# Altium footprint library Mi Libreria.PcbLib: 184 footprints (part 8 of 12)
Each footprint in its own frame and in the unit in brackets; x right, y up, seen from the top. Pads: shape width x height; smd on the part's side, far side on the other; paste and mask are expansions set on the pad; w line width, h text height; cw(c..) or ccw(c..) is an arc to the next point about the centre after c.
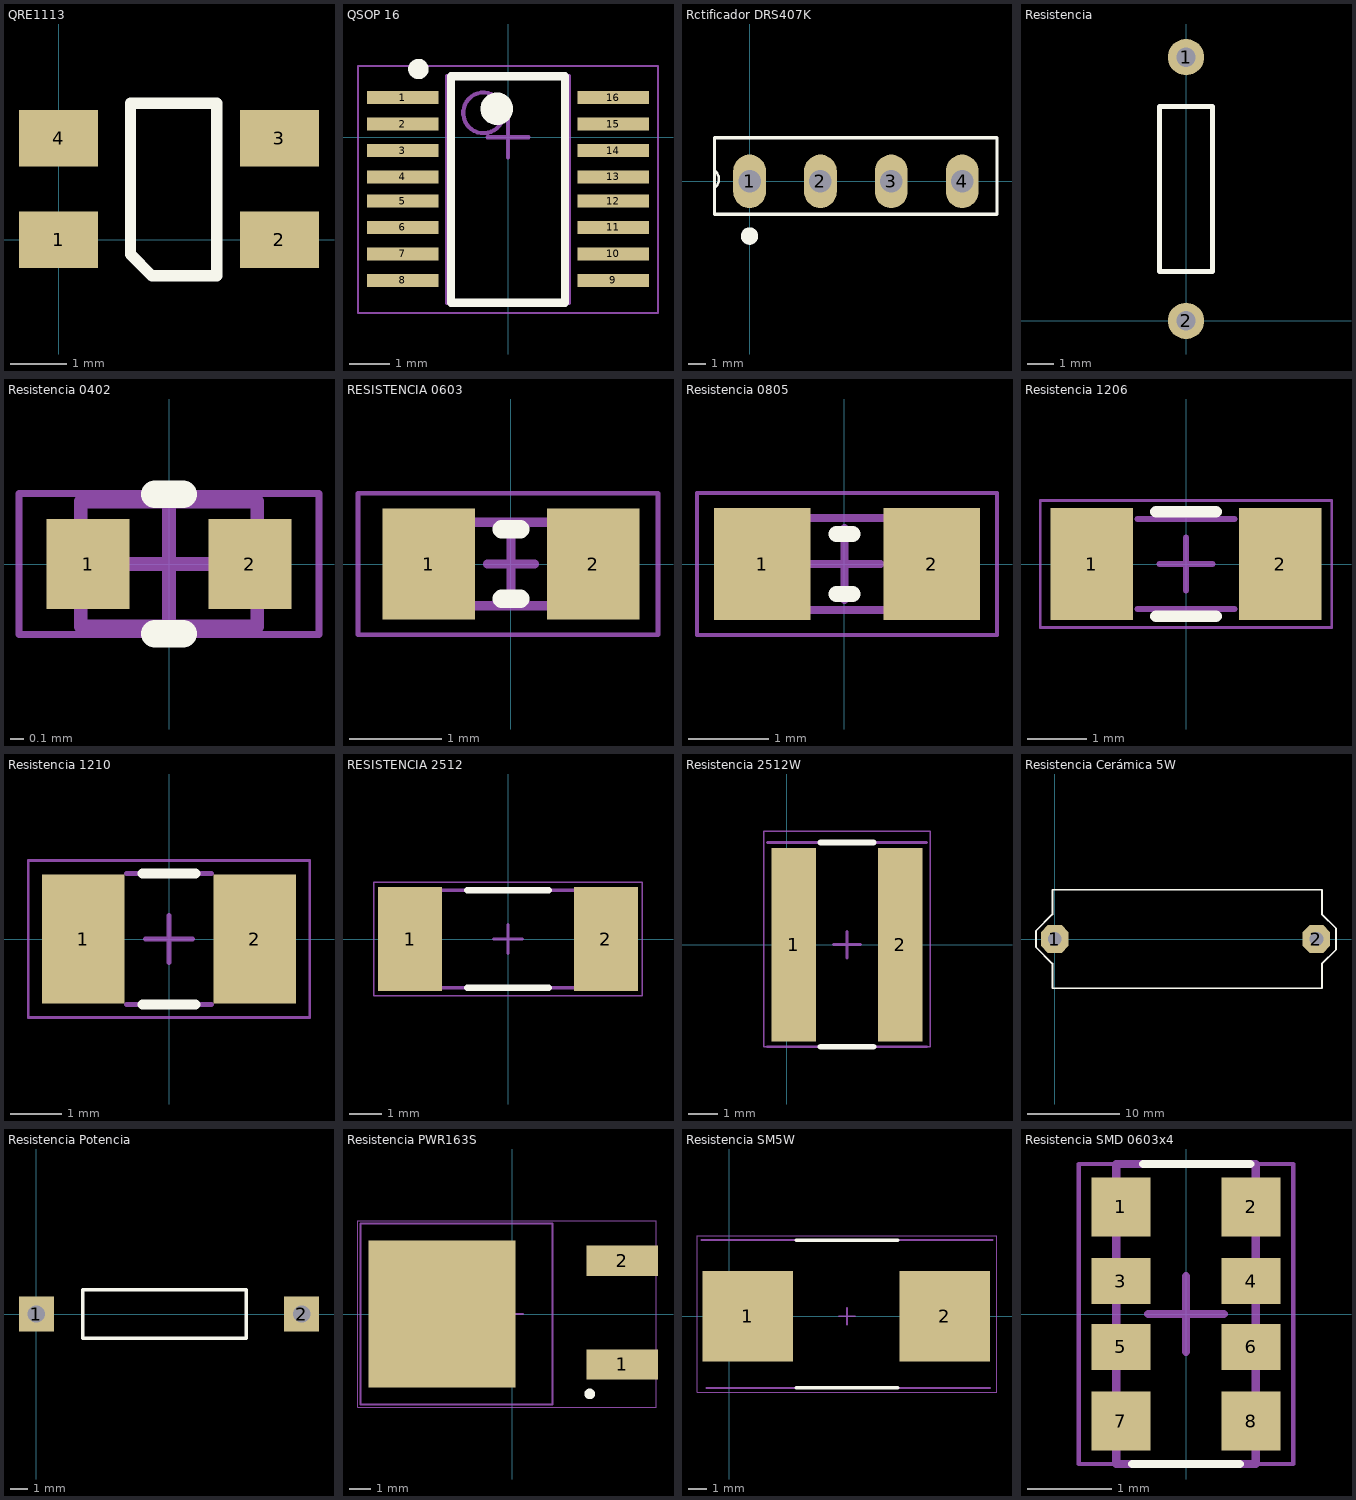
[diagram p7: the footprints below, top view; thin cyan lines are the x and y axes]

## QRE1113 [mm] "Reflective Sensor"
pads (4):
  rect 1.4x1 smd: 1(0,0) 2(3.9,0) 3(3.9,1.8) 4(0,1.8)
Top Overlay:
  lines w0.2: 1.27,-0.254 1.27,2.413 2.794,2.413 2.794,-0.635 1.651,-0.635 1.27,-0.254
3D body: height 1.6, standoff 0, extent 0.635,-0.635 3.302,2.54
3D body: height 0.35, standoff 0, extent -0.127,1.397 0.889,2.159
3D body: height 1, standoff 0, extent 0.381,1.397 0.889,2.159
3D body: height 0.35, standoff 0, extent -0.127,-0.381 0.889,0.381
3D body: height 0.35, standoff 0, extent 3.048,-0.381 4.064,0.381
3D body: height 0.35, standoff 0, extent 3.048,1.397 4.064,2.159
3D body: height 1, standoff 0, extent 0.381,-0.381 0.889,0.381
3D body: height 1, standoff 0, extent 3.048,1.397 3.556,2.159
3D body: height 1, standoff 0, extent 3.048,-0.381 3.556,0.381
3D body: height 1.8, standoff 0, extent 0.762,1.27 3.048,2.159
3D body: height 1.8, standoff 0, extent 0.762,-0.381 3.048,0.635

## QSOP 16 [mm] "QSOP 16 SMT"
pads (16):
  rect 1.75x0.325 smd: 1(-2.581,0.975) 2(-2.581,0.325) 3(-2.581,-0.325) 4(-2.581,-0.975) 5(-2.581,-1.565) 6(-2.581,-2.215) 7(-2.581,-2.865) 8(-2.581,-3.515) 9(2.581,-3.515) 10(2.581,-2.865) 11(2.581,-2.215) 12(2.581,-1.565) 13(2.581,-0.975) 14(2.581,-0.325) 15(2.581,0.325) 16(2.581,0.975)
Top Overlay:
  circle w0.25: c-2.2,1.675 r0.125
  circle w0.4: c-0.275,0.7 r0.2
  lines w0.2: -1.397,-4.064 -1.397,1.5 1.397,1.5 1.397,-4.064 -1.397,-4.064
Mechanical 13:
  circle w0.1: c-0.6,0.6 r0.5
  lines w0.1: -1.5,-4.064 -1.5,1.5 1.5,1.5 1.5,-4.064 -1.5,-4.064
Mechanical 15:
  lines w0.05: -3.683,-4.318 -3.683,1.75 3.683,1.75 3.683,-4.318 -3.683,-4.318
  lines w0.1: -0.5,0 0.5,0 ; 0,-0.5 0,0.5
3D body "QSOP16.step": height 3.12, standoff 0.03, extent -3.01,-3.715 3.01,1.175

## Rctificador DRS407K [mm] "DRS407K  Bridge Rectifier 4A"
pads (4):
  oval 1.9x3.1 hole 1.3: 1(0,0) 2(4.11,0) 3(8.22,0) 4(12.33,0)
Top Overlay:
  circle w0.5: c0,-3.175 r0.254
  lines w0.15: -2.032,-0.381 ccw(c-2.413,0.127) -2.032,0.635
  lines w0.2: 14.351,2.536 -2.032,2.54 -2.032,-1.905 14.351,-1.905 14.351,2.54
3D body: height 12, standoff 1, extent -1.524,-1.651 13.97,1.905
3D body: height 2, standoff -1, extent 11.884,-0.449 12.78,0.449
3D body: height 2, standoff -1, extent 7.774,-0.449 8.67,0.449
3D body: height 2, standoff -1, extent 3.664,-0.449 4.56,0.449
3D body: height 2, standoff -1, extent -0.446,-0.449 0.45,0.449

## Resistencia [mm] "Trough Hole 1/4W"
pads (2):
  round 1.4 hole 0.75: 1(0,10.16) 2(0,0)
Top Overlay:
  lines w0.2: -1.016,1.905 -1.016,8.255 1.016,8.255 1.016,1.905 -1.016,1.905
3D body "SW3dPS-RESISTOR, 0.25 W, 0.4 IN LEAD PITCH.STEP": height 2.93, standoff -2.54, extent -1.156,-0.305 1.156,10.465

## Resistencia 0402 [mm]
pads (2):
  rect 0.6x0.65 smd: 1(-0.583,0) 2(0.582,0)
Top Overlay:
  lines w0.2: -0.1,-0.502 0.1,-0.502 ; -0.1,0.502 0.1,0.502
Mechanical 13:
  lines w0.1: -0.635,-0.45 -0.635,0.45 0.635,0.45 0.635,-0.45 -0.635,-0.45
Mechanical 15:
  lines w0.05: -1.079,-0.508 -1.079,0.508 1.079,0.508 1.079,-0.508 -1.079,-0.508
  lines w0.1: -0.45,0 0.45,0 ; 0,-0.45 0,0.45
3D body "RESISTENCIA 0402.step": height 0.41, standoff 0, extent -0.575,-0.275 0.575,0.275

## RESISTENCIA 0603 [mm] "Chip Resistor, 2-Leads, Body 1.63x0.85mm, IPC Medium Density"
height 0.6
pads (2):
  rect 1x1.2 smd: 1(-0.889,0) 2(0.889,0)
Top Overlay:
  lines w0.2: -0.1,-0.375 0.1,-0.375 ; -0.1,0.375 0.1,0.375
Mechanical 13:
  lines w0.1: -0.825,-0.45 0.825,-0.45 0.825,0.45 -0.825,0.45 -0.825,-0.45
Mechanical 15:
  lines w0.05: -1.651,-0.762 1.587,-0.762 1.587,0.762 -1.651,0.762 -1.651,-0.762
  lines w0.1: -0.254,0 0.254,0 ; 0,-0.45 0,0.45
3D body: height 0.6, standoff 0, extent -0.495,-0.45 0.495,0.45
3D body: height 0.6, standoff 0, extent 0.495,-0.45 0.825,0.45
3D body: height 0.6, standoff 0, extent -0.825,-0.45 -0.495,0.45

## Resistencia 0805 [mm] "RESISTENCIA SMD 0805"
pads (2):
  rect 1.2x1.4 smd: 1(-1.027,0) 2(1.09,0)
Top Overlay:
  lines w0.2: -0.1,-0.375 0.1,-0.375 ; -0.1,0.375 0.1,0.375
Mechanical 13:
  lines w0.1: -0.825,-0.577 0.825,-0.577 ; -0.825,-0.45 -0.825,0.45 ; -0.825,0.577 0.825,0.577 ; 0.825,-0.45 0.825,0.45
Mechanical 15:
  lines w0.05: -1.841,-0.889 -1.841,0.889 1.905,0.889 1.905,-0.889 -1.841,-0.889
  lines w0.1: -0.45,0 0.45,0 ; 0,-0.45 0,0.45
3D body "SW3dPS-0805 SMD Resistor.STEP": height 0.78, standoff 0, extent -1,-0.635 1,0.615
3D body: height 0.6, standoff 0, extent -0.825,-0.45 -0.495,0.45
3D body: height 0.6, standoff 0, extent 0.495,-0.45 0.825,0.45

## Resistencia 1206 [mm] "Resistencia 1206 SMD"
pads (2):
  rect 1.4x1.9 smd: 1(-1.599,0) 2(1.598,0)
Top Overlay:
  lines w0.2: -0.508,-0.889 0.508,-0.889 ; -0.508,0.889 0.508,0.889
Mechanical 13:
  lines w0.1: -0.825,-0.762 0.825,-0.762 ; -0.825,0.762 0.825,0.762
Mechanical 15:
  lines w0.05: -2.476,-1.079 2.476,-1.079 2.476,1.079 -2.476,1.079 -2.476,-1.079
  lines w0.1: -0.45,0 0.45,0 ; 0,-0.45 0,0.45
3D body "Resistencia 12'6.STEP": height 0.85, standoff 0, extent -1.675,-0.865 1.675,0.865

## Resistencia 1210 [mm]
pads (2):
  rect 1.6x2.5 smd: 1(-1.662,0) 2(1.662,0)
Top Overlay:
  lines w0.2: -0.508,-1.27 0.508,-1.27 ; -0.508,1.27 0.508,1.27
Mechanical 13:
  lines w0.1: -0.825,-1.27 0.825,-1.27 ; -0.825,1.27 0.825,1.27
Mechanical 15:
  lines w0.05: -2.73,-1.524 2.73,-1.524 2.73,1.524 -2.73,1.524 -2.73,-1.524
  lines w0.1: -0.45,0 0.45,0 ; 0,-0.45 0,0.45
3D body "RESISTENCIA 1210.step": height 0.55, standoff 0, extent -1.6,-1.25 1.6,1.25

## RESISTENCIA 2512 [mm]
pads (2):
  rect 2x3.25 smd: 1(-3.059,0) 2(3.059,0)
Top Overlay:
  lines w0.2: -1.27,-1.524 1.27,-1.524 ; -1.27,1.524 1.27,1.524
Mechanical 13:
  lines w0.1: -3.175,-1.524 3.302,-1.524 ; -3.175,1.524 3.302,1.524
Mechanical 15:
  lines w0.05: -4.191,-1.778 4.191,-1.778 4.191,1.778 -4.191,1.778 -4.191,-1.778
  lines w0.1: -0.45,0 0.45,0 ; 0,-0.45 0,0.45
3D body "RES2512.step": height 0.55, standoff 0, extent -3.35,-1.6 3.35,1.6

## Resistencia 2512W [mm] "Resistencia SMD 2512W 2W"
pads (2):
  rect 1.5x6.5 smd: 1(0.243,0) 2(3.821,0)
Top Overlay:
  lines w0.2: 1.143,-3.429 2.921,-3.429 ; 1.143,3.429 2.921,3.429
Mechanical 13:
  lines w0.1: -0.635,-3.429 4.699,-3.429 ; -0.635,3.429 4.699,3.429
Mechanical 15:
  lines w0.05: -0.762,-3.429 -0.762,3.81 4.826,3.81 4.826,-3.429 -0.762,-3.429
  lines w0.1: 1.582,0 2.482,0 ; 2.032,-0.45 2.032,0.45
3D body "R2512W.step": height 0.61, standoff 0, extent 0.456,-3.15 3.556,3.15

## Resistencia Cerámica 5W [mm] "Cement Resistor TH PCB Horizontal 5W"
pads (2):
  oct 3x3 hole 1.5: 1(0,0) 2(28.349,0)
Top Overlay:
  lines w0.2: -2.032,-0.889 -2.032,0.889 -0.254,2.667 -0.254,5.334 28.956,5.334 28.956,2.667 30.48,1.143 30.48,-1.143 28.956,-2.667 28.956,-5.334 -0.254,-5.334 -0.254,-2.667 -2.032,-0.889
3D body "Resistor Cement 5W 5R6 PCB Horizontal.step": height 9, standoff -3.6, extent 0.006,-5 28.696,5

## Resistencia Potencia [mm] "R 2W 0.6 In."
pads (2):
  rect 2x2 hole 1: 1(0,0) 2(15.24,0)
Top Overlay:
  lines w0.2: 2.667,-1.397 2.667,1.397 12.065,1.397 12.065,-1.397 2.667,-1.397
3D body "Resistor 2W.STEP": height 5, standoff -3, extent -0.527,-2.032 15.513,1.968

## Resistencia PWR163S [mm] "Resistencia PWR163S 25W SMD"
pads (3):
  rect 3.4x1.45 smd: 1(5.239,-2.407) 2(5.239,2.534)
  rect 7x7 smd: ""(-3.366,0)
Top Overlay:
  circle w0.25: c3.683,-3.81 r0.127
Mechanical 13:
  lines w0.1: -7.239,-4.318 1.905,-4.318 1.905,4.318 -7.239,4.318 -7.239,-4.318
Mechanical 15:
  lines w0.05: -7.366,-4.445 6.858,-4.445 6.858,4.445 -7.366,4.445 -7.366,-4.445
  lines w0.1: -0.5,0 0.5,0 ; 0,-0.5 0,0.5
3D body "DPAK.STEP": height 2.39, standoff -0.02, extent -4.223,-3.27 5.715,3.27

## Resistencia SM5W [mm] "SMW510RJT 5W 5329"
pads (2):
  rect 5x5 smd: 1(1.016,0) 2(11.857,0)
Top Overlay:
  lines w0.2: 3.683,-3.937 9.271,-3.937 ; 3.683,4.191 9.271,4.191
Mechanical 13:
  lines w0.1: -1.524,4.191 14.478,4.191 ; -1.27,-3.937 14.351,-3.937
Mechanical 15:
  lines w0.05: -1.778,-4.191 -1.778,4.445 14.732,4.445 14.732,-4.191 -1.778,-4.191
  lines w0.1: 6.027,0 6.927,0 ; 6.477,-0.45 6.477,0.45
3D body "RES 5329 5W.step": height 6.81, standoff 0, extent -0.152,-3.67 13.36,3.924

## Resistencia SMD 0603x4 [mm] "Resistor Network 0603x4"
pads (8):
  rect 0.7x0.7 smd: 1(-0.773,1.27) 2(0.773,1.27) 7(-0.773,-1.27) 8(0.773,-1.27)
  rect 0.7x0.55 smd: 3(-0.773,0.391) 4(0.773,0.391) 5(-0.773,-0.391) 6(0.773,-0.391)
Top Overlay:
  lines w0.1: -0.635,-1.778 0.635,-1.778 ; -0.508,1.778 0.762,1.778
Mechanical 13:
  lines w0.1: -0.825,-1.778 -0.825,1.778 0.825,1.778 0.825,-1.778 -0.825,-1.778
Mechanical 15:
  lines w0.05: -1.27,-1.778 -1.27,1.778 1.27,1.778 1.27,-1.778 -1.27,-1.778
  lines w0.1: -0.45,0 0.45,0 ; 0,-0.45 0,0.45
3D body "RES 4X0603.step": height 0.65, standoff 0, extent -0.8,-1.6 0.8,1.6